# Altium footprint library LDCN Components.PcbLib: 426 footprints (part 26 of 27)
Each footprint in its own frame and in the unit in brackets; x right, y up, seen from the top. Pads: shape width x height; smd on the part's side, far side on the other; paste and mask are expansions set on the pad; w line width, h text height; cw(c..) or ccw(c..) is an arc to the next point about the centre after c.
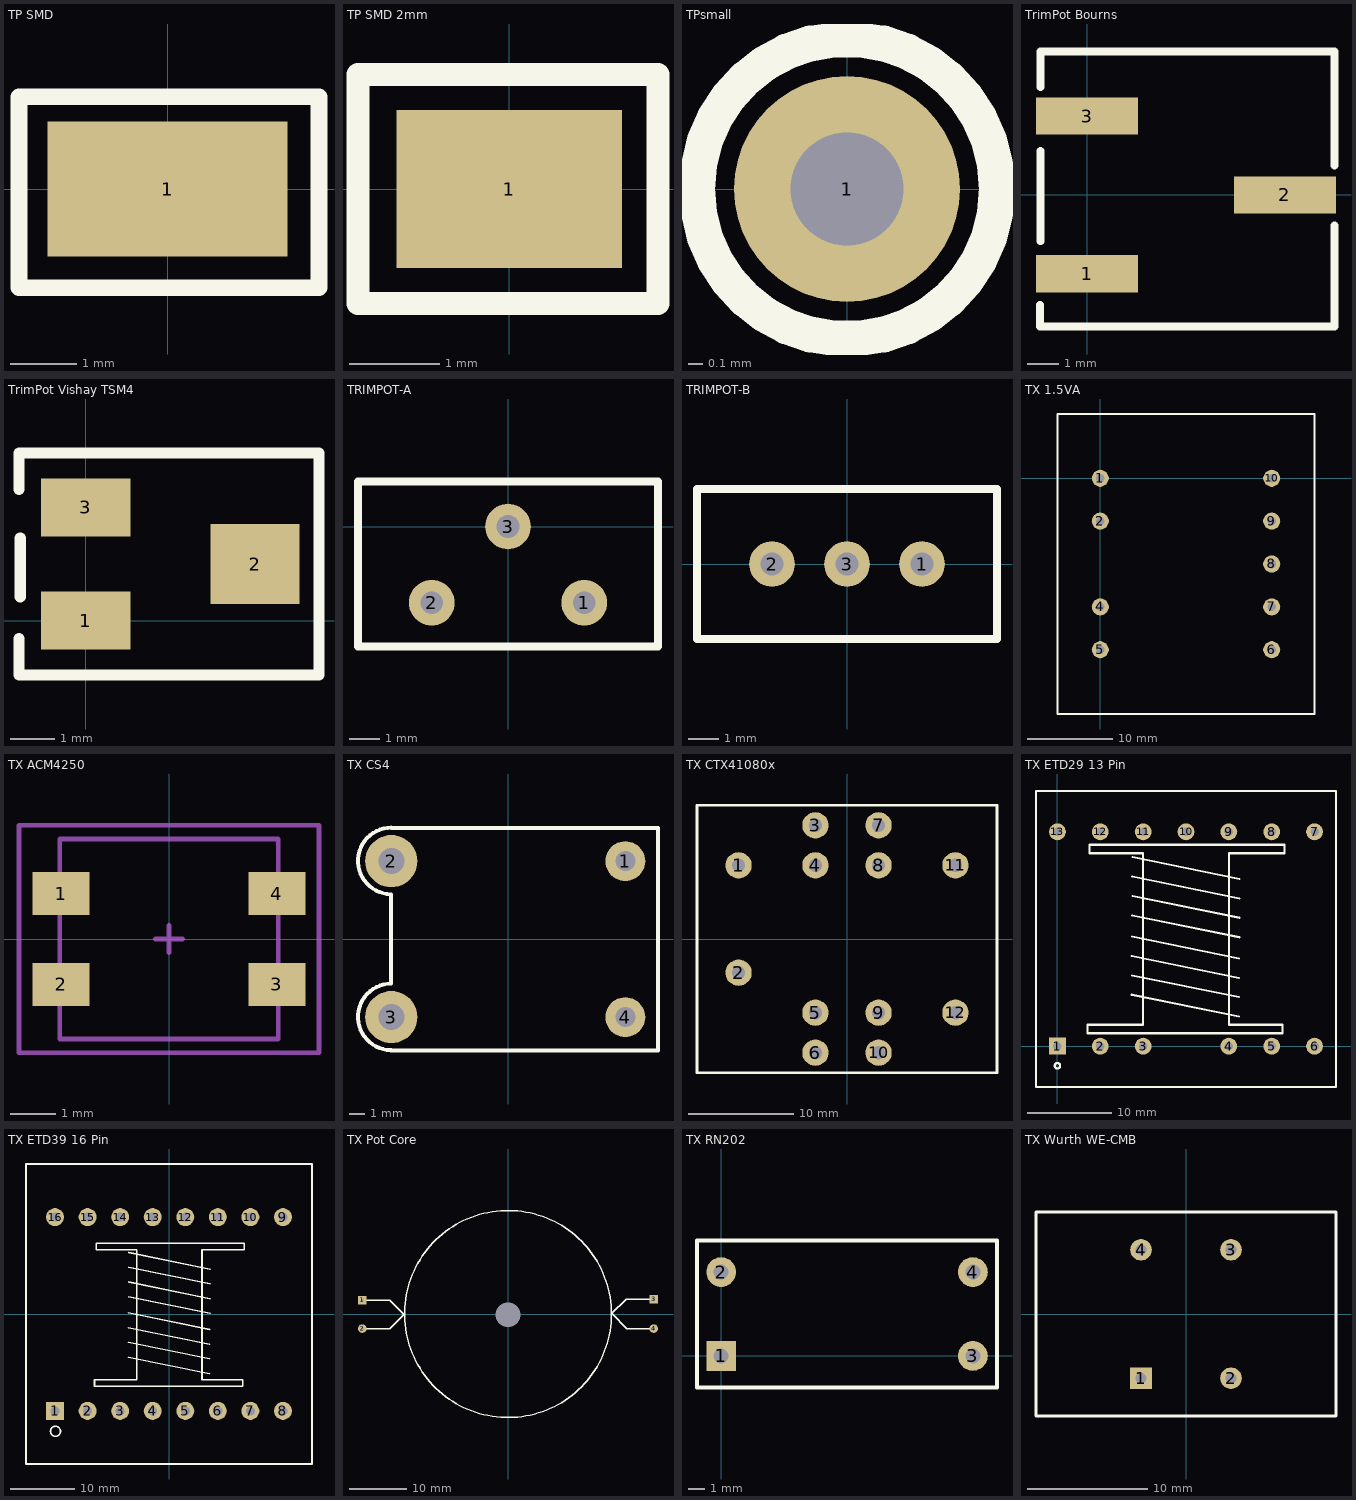
[diagram p25: the footprints below, top view; thin cyan lines are the x and y axes]

## TP SMD [mm] "Test Point SMD"
height 2
pads (1):
  rect 3.65x2.05 smd: 1(0,0)
Top Overlay:
  lines w0.254: -2.258,1.392 -2.258,-1.5 2.3,-1.5 2.3,1.4 -2.258,1.4

## TP SMD 2mm [mm] "Test Point SMD"
height 2
pads (1):
  rect 2.5x1.75 smd: 1(0,0)
Top Overlay:
  lines w0.254: -1.676,-1.27 -1.676,1.27 1.651,1.27 1.651,-1.27 -1.676,-1.27

## TPsmall [mm] "Small Test Point"
pads (1):
  round 1.6 hole 0.8: 1(0,0)
Top Overlay:
  circle w0.254: c0,0 r1.063

## TrimPot Bourns [mm] "Trimming Potentiometer SM"
pads (3):
  rect 3.3x1.2 smd: 1(0,-2.55) 2(6.4,0) 3(0,2.55)
Top Overlay:
  lines w0.254: -1.524,-3.556 -1.524,-4.255 8,-4.255 8,-0.984 ; -1.5,-1.5 -1.5,1.421 ; -1.5,3.492 -1.5,4.635 8,4.635 8,0.953

## TrimPot Vishay TSM4 [mm] "Trimming Potentiometer SM"
pads (3):
  rect 2x1.3 smd: 1(0,0) 3(0,2.54)
  rect 2x1.8 smd: 2(3.8,1.27)
Top Overlay:
  lines w0.254: -1.499,-0.406 -1.499,-1.219 5.232,-1.219 5.232,3.759 -1.499,3.759 -1.499,2.946 ; -1.473,0.533 -1.473,1.854

## TRIMPOT-A [mil]
pads (3):
  round 60 hole 30: 1(100,-100) 2(-100,-100) 3(0,0)
Top Overlay:
  lines w10: -196.85,-157.48 -196.85,59.06 196.85,59.06 196.85,-157.48 -196.85,-157.48

## TRIMPOT-B [mil]
pads (3):
  round 60 hole 30: 1(98.43,0) 2(-98.43,0) 3(0,0)
Top Overlay:
  lines w10: -196.85,-98.43 196.85,-98.43 196.85,98.43 -196.85,98.43 -196.85,-98.43

## TX 1.5VA [mm] "Block AVB 1.5VA Transformer"
height 25
pads (9):
  round 2 hole 1: 1(0,0) 2(0,-5) 4(0,-15) 5(0,-20) 6(20,-20) 7(20,-15) 8(20,-10) 9(20,-5) 10(20,0)
Top Overlay:
  lines w0.254: -5,-27.5 25,-27.5 25,7.5 -5,7.5 -5,-27.5

## TX ACM4250 [mm] "TDK AMC4250"
height 4
pads (4):
  rect 1.25x0.95 smd: 1(-2.375,1) 2(-2.375,-1) 3(2.375,-1) 4(2.375,1)
Mechanical 13:
  lines w0.1: -2.4,-2.2 2.4,-2.2 2.4,2.2 -2.4,2.2 -2.4,-2.2
Mechanical 15:
  lines w0.1: -0.3,0 0.3,0 ; 0,-0.3 0,0.3 ; -3.3,-2.5 -3.3,2.5 3.3,2.5 3.3,-2.5 -3.3,-2.5
3D body: height 4, standoff 0, extent -2.4,-2.2 2.4,2.2

## TX CS4 [mm] "Coilcraft current transformer"
height 20
pads (4):
  round 2.6 hole 1.3: 1(7.62,5.08) 4(7.62,-5.08)
  round 3.4 hole 1.7: 2(-7.62,5.08) 3(-7.62,-5.08)
Top Overlay:
  lines w0.254: -7.65,-7.25 9.75,-7.25 9.75,7.25 -7.625,7.25 ; -7.65,-7.235 cw(c-7.621,-5.065) -7.625,-2.895 ; -7.65,-2.871 -7.65,2.925 cw(c-7.621,5.095) -7.625,7.265

## TX CTX41080x [mm] "Coiltronics TX"
height 15
pads (12):
  round 2.5 hole 1.25: 1(-10.3,7) 2(-10.3,-3.2) 3(-3,10.8) 4(-3,7) 5(-3,-7) 6(-3,-10.8) 7(3,10.8) 8(3,7) 9(3,-7) 10(3,-10.8) 11(10.3,7) 12(10.3,-7)
Top Overlay:
  lines w0.254: -14.25,-12.7 14.25,-12.7 14.25,12.7 -14.25,12.7 -14.25,-12.7

## TX ETD29 13 Pin [mm] "FERROXCUBE -CPH-ETD29-1S-13P"
height 25
pads (13):
  rect 2x2 hole 1: 1(0,0)
  round 2 hole 1: 2(5.08,0) 3(10.16,0) 4(20.32,0) 5(25.4,0) 6(30.48,0) 7(30.48,25.4) 8(25.4,25.4) 9(20.32,25.4) 10(15.24,25.4) 11(10.16,25.4) 12(5.08,25.4) 13(0,25.4)
Top Overlay:
  circle w0.254: c0,-2.326 r0.325
  lines w0.254: 8.815,10.683 21.515,8.093 ; 8.816,6.086 21.516,3.496 ; 8.831,12.991 21.531,10.401 ; 8.831,8.394 21.531,5.804 ; 8.875,20.094 21.575,17.504 ; 8.876,15.497 21.576,12.907 ; 8.89,22.402 21.59,19.812 ; 8.891,17.805 21.591,15.215 ; -2.54,-4.826 33.02,-4.826 33.02,30.226 -2.54,30.226 -2.54,-4.826 ; 3.556,1.524 3.556,2.54 10.16,2.54 10.16,22.86 3.81,22.86 3.81,23.876 26.924,23.876 26.924,22.86 20.32,22.86 20.32,2.54 26.67,2.54 26.67,1.524 3.556,1.524

## TX ETD39 16 Pin [mm] "FERROXCUBE - CPH-ETD39-1S-16P-C"
height 35
pads (16):
  rect 2.8x2.8 hole 1.4: 1(-17.78,-15.113)
  round 2.8 hole 1.4: 2(-12.7,-15.113) 3(-7.62,-15.113) 4(-2.54,-15.113) 5(2.54,-15.113) 6(7.62,-15.113) 7(12.7,-15.113) 8(17.78,-15.113) 9(17.78,15.113) 10(12.7,15.113) 11(7.62,15.113) 12(2.54,15.113) 13(-2.54,15.113) 14(-7.62,15.113) 15(-12.7,15.113) 16(-17.78,15.113)
Top Overlay:
  circle w0.254: c-17.7,-18.3 r0.781
  lines w0.254: -6.365,-2.13 6.335,-4.72 ; -6.364,-6.727 6.336,-9.317 ; -6.349,0.178 6.351,-2.412 ; -6.349,-4.419 6.351,-7.009 ; -6.305,7.281 6.395,4.691 ; -6.304,2.684 6.396,0.094 ; -6.29,9.589 6.41,6.999 ; -6.289,4.992 6.411,2.402 ; -22.3,-23.4 22.3,-23.4 22.3,23.4 -22.3,23.4 -22.3,-23.4 ; -11.624,-11.289 11.49,-11.289 11.49,-10.273 5.14,-10.273 5.14,10.047 11.744,10.047 11.744,11.063 -11.37,11.063 -11.37,10.047 -5.02,10.047 -5.02,-10.273 -11.624,-10.273 -11.624,-11.289

## TX Pot Core [mm]
height 30
pads (5):
  rect 0x0 hole 4.3: 0(0,-0.127)
  rect 1.5x1.5 hole 0.5: 1(-25.4,2.413) 3(25.4,2.54)
  round 1.5 hole 0.5: 2(-25.4,-2.54) 4(25.4,-2.54)
Top Overlay:
  circle w0.254: c0,0 r18.036
  lines w0.254: -25.4,2.413 -20.574,2.413 -18.161,0 -18.161,-0.127 -20.574,-2.54 -24.892,-2.54 ; 18.036,0 18.036,0.002 ; 25.4,2.54 20.574,2.54 18.036,0.002 ; 25.654,-2.54 20.701,-2.54 18.159,0.002 18.036,0.002

## TX RN202 [mm] "Schaffner RN202 Series"
height 13.5
pads (4):
  rect 1.8x1.8 hole 0.9: 1(0,0)
  round 1.8 hole 0.9: 2(0,5.08) 3(15.24,0) 4(15.24,5.08)
Top Overlay:
  lines w0.254: -1.46,-1.905 -1.46,6.985 16.699,6.985 16.699,-1.905 -1.46,-1.905

## TX Wurth WE-CMB [mm] "Wurth WE-CMB"
height 26.5
pads (4):
  rect 1.8x1.8 hole 0.9: 1(-3.75,-5.35)
  round 1.8 hole 0.9: 2(3.75,-5.35) 3(3.75,5.35) 4(-3.75,5.35)
Top Overlay:
  lines w0.254: -12.5,-8.5 12.5,-8.5 12.5,8.5 -12.5,8.5 -12.5,-8.5